# Altium footprint library dcdc_ldo_ref.pcblib: 40 footprints (part 2 of 3)
Each footprint in its own frame and in the unit in brackets; x right, y up, seen from the top. Pads: shape width x height; smd on the part's side, far side on the other; paste and mask are expansions set on the pad; w line width, h text height; cw(c..) or ccw(c..) is an arc to the next point about the centre after c.
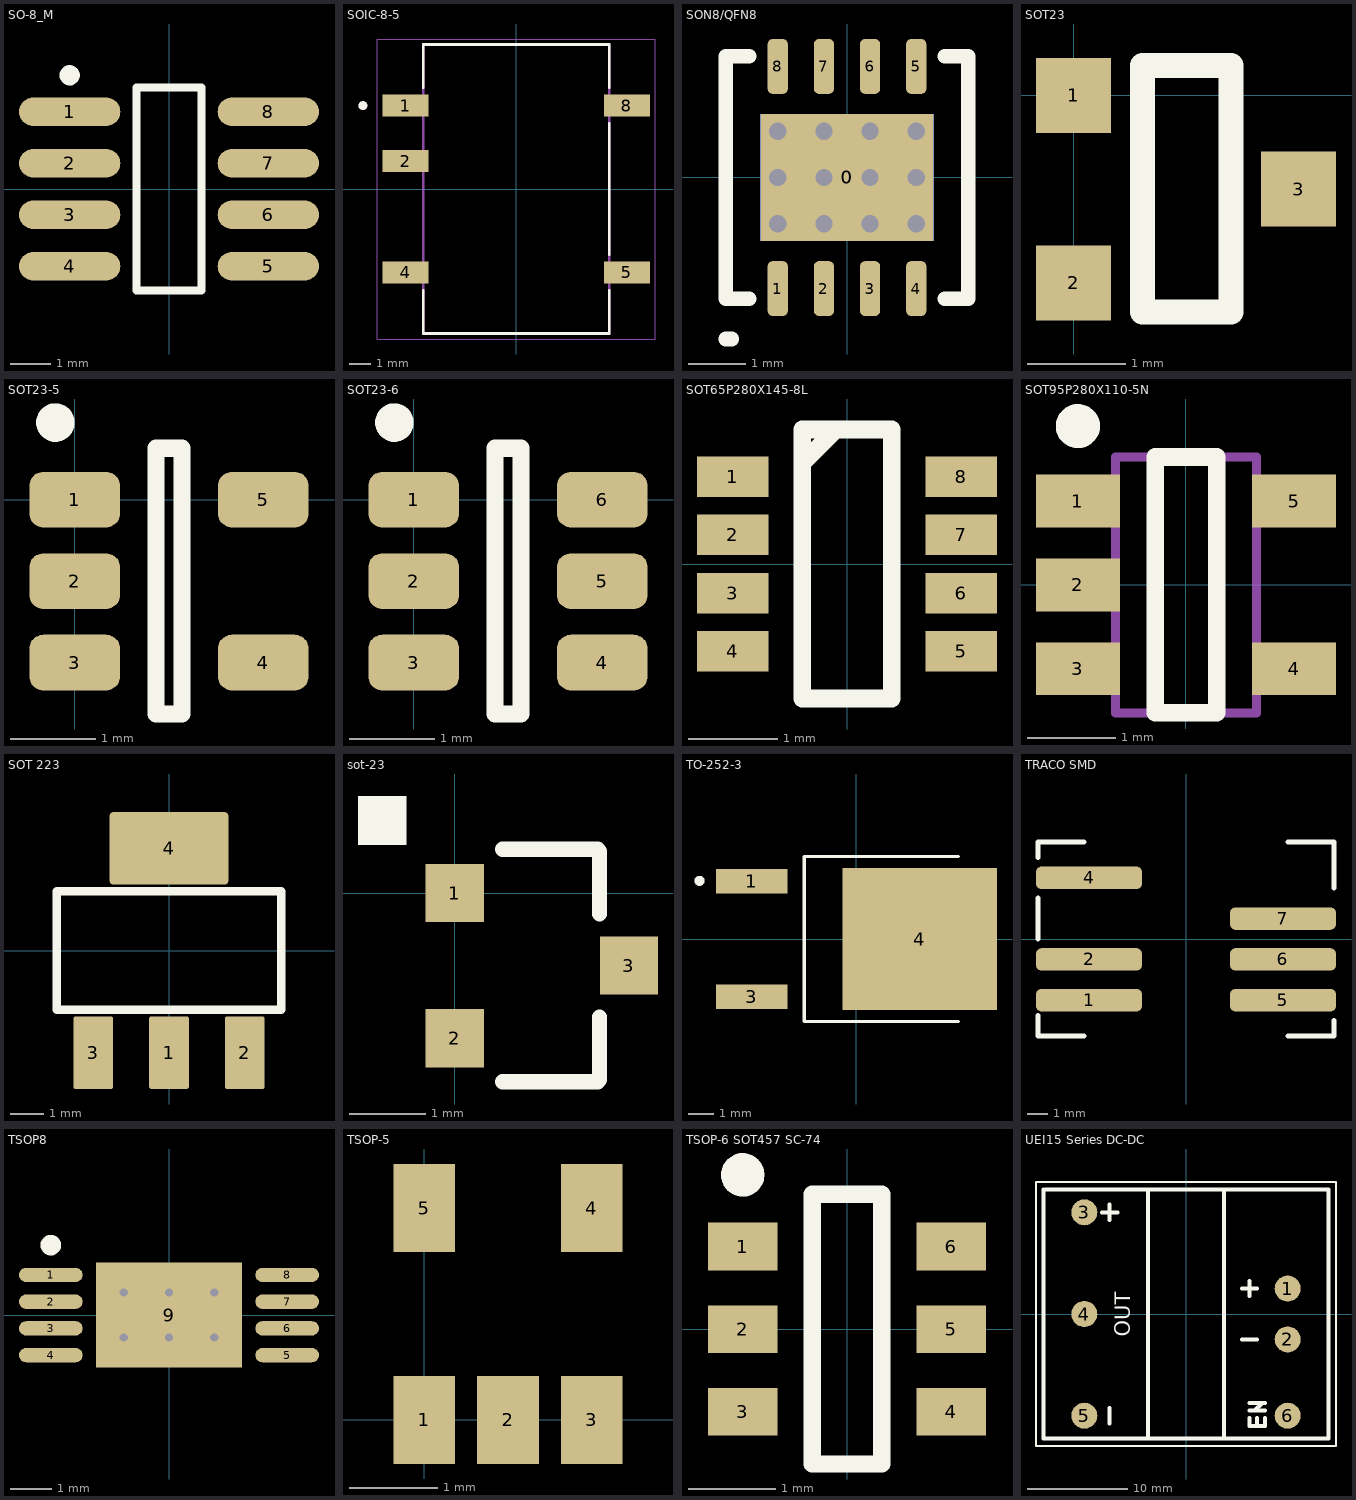
[diagram p1: the footprints below, top view; thin cyan lines are the x and y axes]

## SO-8_M [mm] "SOIC, 8-Leads, Body 4.9x3.9mm, Pitch 1.27mm, IPC Low Density"
height 1.75
pads (8):
  oval 2.5x0.7 smd: 1(-2.45,1.905) 2(-2.45,0.635) 3(-2.45,-0.635) 4(-2.45,-1.905) 5(2.45,-1.905) 6(2.45,-0.635) 7(2.45,0.635) 8(2.45,1.905)
Top Overlay:
  circle w0.25: c-2.45,2.805 r0.125
  lines w0.2: -0.8,-2.5 -0.8,2.5 0.8,2.5 0.8,-2.5 -0.8,-2.5
3D body "so-8.step": height 1.88, standoff -0.03, extent -3.169,-2.515 3.169,2.489

## SOIC-8-5 [mm]
pads (5):
  rect 2.1x1 smd: 1(-5.05,3.81) 2(-5.05,1.27) 4(-5.05,-3.81) 5(5.05,-3.81) 8(5.05,3.81)
Top Overlay:
  circle w0.2: c-7,3.81 r0.1
  lines w0.127: -4.25,-4.63 -4.25,-6.6 4.25,-6.6 4.25,-4.63 ; -4.25,4.63 -4.25,6.6 4.25,6.6 4.25,4.63 ; 4.25,-2.99 4.25,2.99
Plata3D:
  circle w0.2: c-7,3.81 r0.1
  lines w0.127: -4.25,-6.6 -4.25,6.6 4.25,6.6 4.25,-6.6 -4.25,-6.6
Board3D:
  lines w0.05: -6.35,-6.85 6.35,-6.85 6.35,6.85 -6.35,6.85 -6.35,-6.85
3D body "step_temp.STEP": height 7.25, standoff 0, extent -5.7,-6.6 5.7,6.6

## SON8/QFN8 [mm] "SON8/QFN8"
pads (10):
  rect 3x2.2 smd mask+0.07: 0(0,0)
  rect 3x2.2 smd far side mask+0.07: 0(0,0)
  rrect50% 0.35x0.95 smd mask+0.07: 1(-1.2,-1.925) 2(-0.4,-1.925) 3(0.4,-1.925) 4(1.2,-1.925) 5(1.2,1.925) 6(0.4,1.925) 7(-0.4,1.925) 8(-1.2,1.925)
via -0.4,0.8 diameter 0.5 hole 0.3
via 0.4,0.8 diameter 0.5 hole 0.3
via -1.2,0.8 diameter 0.5 hole 0.3
via 1.2,0.8 diameter 0.5 hole 0.3
via -0.4,-0.8 diameter 0.5 hole 0.3
via 0.4,-0.8 diameter 0.5 hole 0.3
via -1.2,-0.8 diameter 0.5 hole 0.3
via 1.2,-0.8 diameter 0.5 hole 0.3
via 1.2,0 diameter 0.5 hole 0.3
via -1.2,0 diameter 0.5 hole 0.3
via 0.4,0 diameter 0.5 hole 0.3
via -0.4,0 diameter 0.5 hole 0.3
Top Overlay:
  lines w0.254: -2.1,-2.8 -2,-2.8 ; -1.7,-2.1 -2.1,-2.1 -2.1,2.1 -1.7,2.1 ; 1.7,-2.1 2.1,-2.1 2.1,2.1 1.7,2.1
3D body "User Library-SON8-4x4mm.step": height 0.85, standoff 0, extent -2,-2.05 2,1.95

## SOT23 [mil]
height 118.11
pads (3):
  rect 30x30 smd: 1(0,0) 2(0,-75) 3(90,-37.5)
Top Overlay:
  lines w10: 27.56,-86.61 27.56,11.81 62.99,11.81 62.99,-86.61 27.56,-86.61
3D body "SOT-23.step": height 41.34, standoff -1.97, extent -4,-97 94.42,21.11

## SOT23-5 [mm]
height 3
pads (5):
  rrect50% 1.06x0.65 smd: 1(0,0) 2(0,-0.95) 3(0,-1.9) 4(2.2,-1.9) 5(2.2,0)
Top Overlay:
  circle w0.25: c-0.225,0.9 r0.1
  lines w0.2: 0.95,-2.5 0.95,0.6 1.25,0.6 1.25,-2.5 0.95,-2.5
3D body "sot235.step": height 1, standoff 0, extent -0.07,-2.41 2.27,0.51

## SOT23-6 [mm]
height 3
pads (6):
  rrect50% 1.06x0.65 smd: 1(0,0) 2(0,-0.95) 3(0,-1.9) 4(2.2,-1.9) 5(2.2,-0.95) 6(2.2,0)
Top Overlay:
  circle w0.25: c-0.225,0.9 r0.1
  lines w0.2: 0.95,-2.5 1.25,-2.5 1.25,0.6 0.95,0.6 0.95,-2.5
3D body "TSOP-6.step": height 1, standoff 0, extent -0.25,-2.45 2.45,0.55

## SOT65P280X145-8L [mm] "SOT23, 8-Leads, Body 2.90x2.80mm, Pitch 0.65mm, IPC High Density"
height 1.45
pads (8):
  rect 0.8x0.45 smd: 1(-1.275,0.975) 2(-1.275,0.325) 3(-1.275,-0.325) 4(-1.275,-0.975) 5(1.275,-0.975) 6(1.275,-0.325) 7(1.275,0.325) 8(1.275,0.975)
Top Overlay:
  lines w0.2: -0.5,1.125 -0.125,1.5 ; -0.5,-1.5 -0.5,1.5 0.5,1.5 0.5,-1.5 -0.5,-1.5
3D body "sot23-8.STEP": height 1.2, standoff 0, extent -1.4,-1.47 1.4,1.47

## SOT95P280X110-5N [mm] "SOT23, 5-Leads, Body 2,90x2,80mm, Pitch 0,95mm, IPC Medium Density"
height 1.1
pads (5):
  rect 0.95x0.6 smd: 1(-1.225,0.95) 2(-1.225,0) 3(-1.225,-0.95) 4(1.225,-0.95) 5(1.225,0.95)
Top Overlay:
  circle w0.25: c-1.225,1.8 r0.125
  lines w0.2: -0.35,-1.45 -0.35,1.45 0.35,1.45 0.35,-1.45 -0.35,-1.45
Plata3D:
  lines w0.1: -0.8,-1.45 0.8,-1.45 0.8,1.45 -0.8,1.45 -0.8,-1.45
3D body: height 1.1, standoff 0.1, extent -0.8,-1.45 0.8,1.45

## SOT 223 [mm]
pads (4):
  rrect10% 1.2x2.2 smd mask+0: 1(0,-3.1) 2(2.3,-3.1) 3(-2.3,-3.1)
  rrect10% 3.6x2.2 smd mask+0: 4(0,3.1)
Top Overlay:
  lines w0.254: -3.4,-1.8 -3.4,1.8 3.4,1.8 3.4,-1.8 0,-1.8 -3.4,-1.8
3D body "User Library-sot-223.step": height 1.64, standoff -0.04, extent -3.25,-3.466 3.25,3.466

## sot-23 [mil]
pads (3):
  rect 30x30 smd: 1(0,0) 2(0,-75) 3(90,-37.5)
Top Overlay:
  region: -50,25 -25,25 -25,50 -50,50
  lines w7.87: 24.61,-97.44 72.83,-97.44 ; 24.61,22.64 72.83,22.64 73.82,22.64 ; 48.72,-97.44 73.82,-97.44 ; 74.8,-96.46 74.8,-63.98 ; 74.8,-10.83 74.8,21.65
3D body "SOT-23.step": height 41.34, standoff -1.97, extent -4,-97 94.42,21.11

## TO-252-3 [mm]
pads (3):
  rect 2.83x0.97 smd: 1(-4.14,2.29) 3(-4.14,-2.29)
  rect 6.1x5.63 smd paste-4: 4(2.51,0)
Top Overlay:
  circle w0.2: c-6.2,2.3 r0.1
  lines w0.127: 4.037,-3.26 -2.063,-3.26 -2.063,3.26 4.037,3.26
Top Paste:
  region: 5.21,-2.28 3.89,-2.28 3.89,-0.54 5.21,-0.54
  region: 1.13,-2.28 -0.19,-2.28 -0.19,-0.54 1.13,-0.54
  region: 3.17,-2.28 1.85,-2.28 1.85,-0.54 3.17,-0.54
  region: 5.21,0.54 3.89,0.54 3.89,2.28 5.21,2.28
  region: 1.13,0.54 -0.19,0.54 -0.19,2.28 1.13,2.28
  region: 3.17,0.54 1.85,0.54 1.85,2.28 3.17,2.28
3D body "CircuitWorks-TO-252.step": height 2.3, standoff 0, extent -4.5,-3.29 5.2,3.29

## TRACO SMD [mm]
pads (6):
  rrect50% 5.2x1.1 smd mask+0.05: 1(-4.75,-3) 2(-4.75,-1) 4(-4.75,3) 5(4.75,-3) 6(4.75,-1) 7(4.75,1)
Top Overlay:
  lines w0.254: -7.25,-3.75 -7.25,-4.75 -5,-4.75 ; -7.25,0 -7.25,2 ; -7.25,4 -7.25,4.75 -5,4.75 ; 5,-4.75 7.25,-4.75 7.25,-4 ; 5,4.75 7.25,4.75 7.25,2.5
3D body "tdn1wism.step": height 10.28, standoff 0.13, extent -7.132,-4.565 7.068,4.535

## TSOP8 [mm] "TSOP, 8-Leads, Body 3,00x4,40mm, Pitch 0,65mm, Thermal Pad 2,55.2x3,55.2mm, IPC Medium Density"
height 1.2
pads (9):
  oval 1.55x0.35 smd: 1(-2.875,0.975) 2(-2.875,0.325) 3(-2.875,-0.325) 4(-2.875,-0.975) 5(2.875,-0.975) 6(2.875,-0.325) 7(2.875,0.325) 8(2.875,0.975)
  rect 3.55x2.55 smd: 9(0,0)
via -1.1,0.55 diameter 0.5 hole 0.2
via 0,0.55 diameter 0.5 hole 0.2
via 1.1,0.55 diameter 0.5 hole 0.2
via -1.1,-0.55 diameter 0.5 hole 0.2
via 0,-0.55 diameter 0.5 hole 0.2
via 1.1,-0.55 diameter 0.5 hole 0.2
Top Overlay:
  circle w0.25: c-2.875,1.7 r0.125
3D body "User Library-TSSOP8.STEP": height 1.15, standoff -0.05, extent -3.2,-1.55 3.2,1.55

## TSOP-5 [mm]
pads (5):
  rect 0.7x1 smd: 1(0,0) 2(0.95,0) 3(1.9,0) 4(1.9,2.4) 5(0,2.4)
3D body "sot235.step": height 1, standoff 0, extent -0.51,0.03 2.41,2.37

## TSOP-6 SOT457 SC-74 [mm]
pads (6):
  rect 0.8x0.55 smd paste-0.05: 1(-1.2,0.95) 2(-1.2,0) 3(-1.2,-0.95) 4(1.2,-0.95) 5(1.2,0) 6(1.2,0.95)
Top Overlay:
  circle w0.25: c-1.2,1.775 r0.125
  lines w0.2: -0.4,-1.55 0.4,-1.55 0.4,1.55 -0.4,1.55 -0.4,-1.55
3D body "SOT95P275X110-6L.step": height 1.1, standoff 0, extent -1.5,-1.55 1.5,1.55

## UEI15 Series DC-DC [mm]
pads (6):
  round 2.6 smd: 1(10.16,2.54) 2(10.16,-2.54) 3(-10.16,10.16) 4(-10.16,0) 5(-10.16,-10.16) 6(10.16,-10.16)
Top Overlay:
  lines w0.2: -14.224,12.446 -13.97,12.446 ; -14.986,-13.208 14.986,-13.208 14.986,13.208 -14.986,13.208 -14.986,12.7 -14.986,-12.954 -14.986,-13.208
  lines w0.4: -14.224,12.446 -14.224,-12.446 14.224,-12.446 14.224,12.446 -13.97,12.446 ; -8.382,10.16 -6.858,10.16 ; -7.62,-10.922 -7.62,-9.398 ; -7.62,9.398 -7.62,10.922 ; -3.81,-12.446 -3.81,12.192 ; 3.81,-12.446 3.81,12.446 ; 5.588,-2.54 7.112,-2.54 ; 5.588,2.54 7.112,2.54 ; 6.35,-10.414 6.35,-11.176 7.874,-11.176 7.874,-10.414 ; 6.35,-9.652 6.858,-9.652 ; 6.35,1.778 6.35,3.302 ; 7.112,-11.176 7.112,-10.414 ; 7.874,-9.652 6.858,-9.652 ; 7.874,-8.89 6.35,-8.89 7.62,-8.89 6.858,-9.652
  text "OUT" at -5.588,-2.286 h1.52
3D body "mps_dcdc_uei_15w_smt_a.step": height 8.3, standoff -0.01, extent -13.97,-12.192 13.97,12.192